# Altium integrated library LEMO Unipole And Multipole Type Connectors.IntLib: 1566 symbols (part 3 of 13) (continued)
## EED.2K.310.CLN (continued)
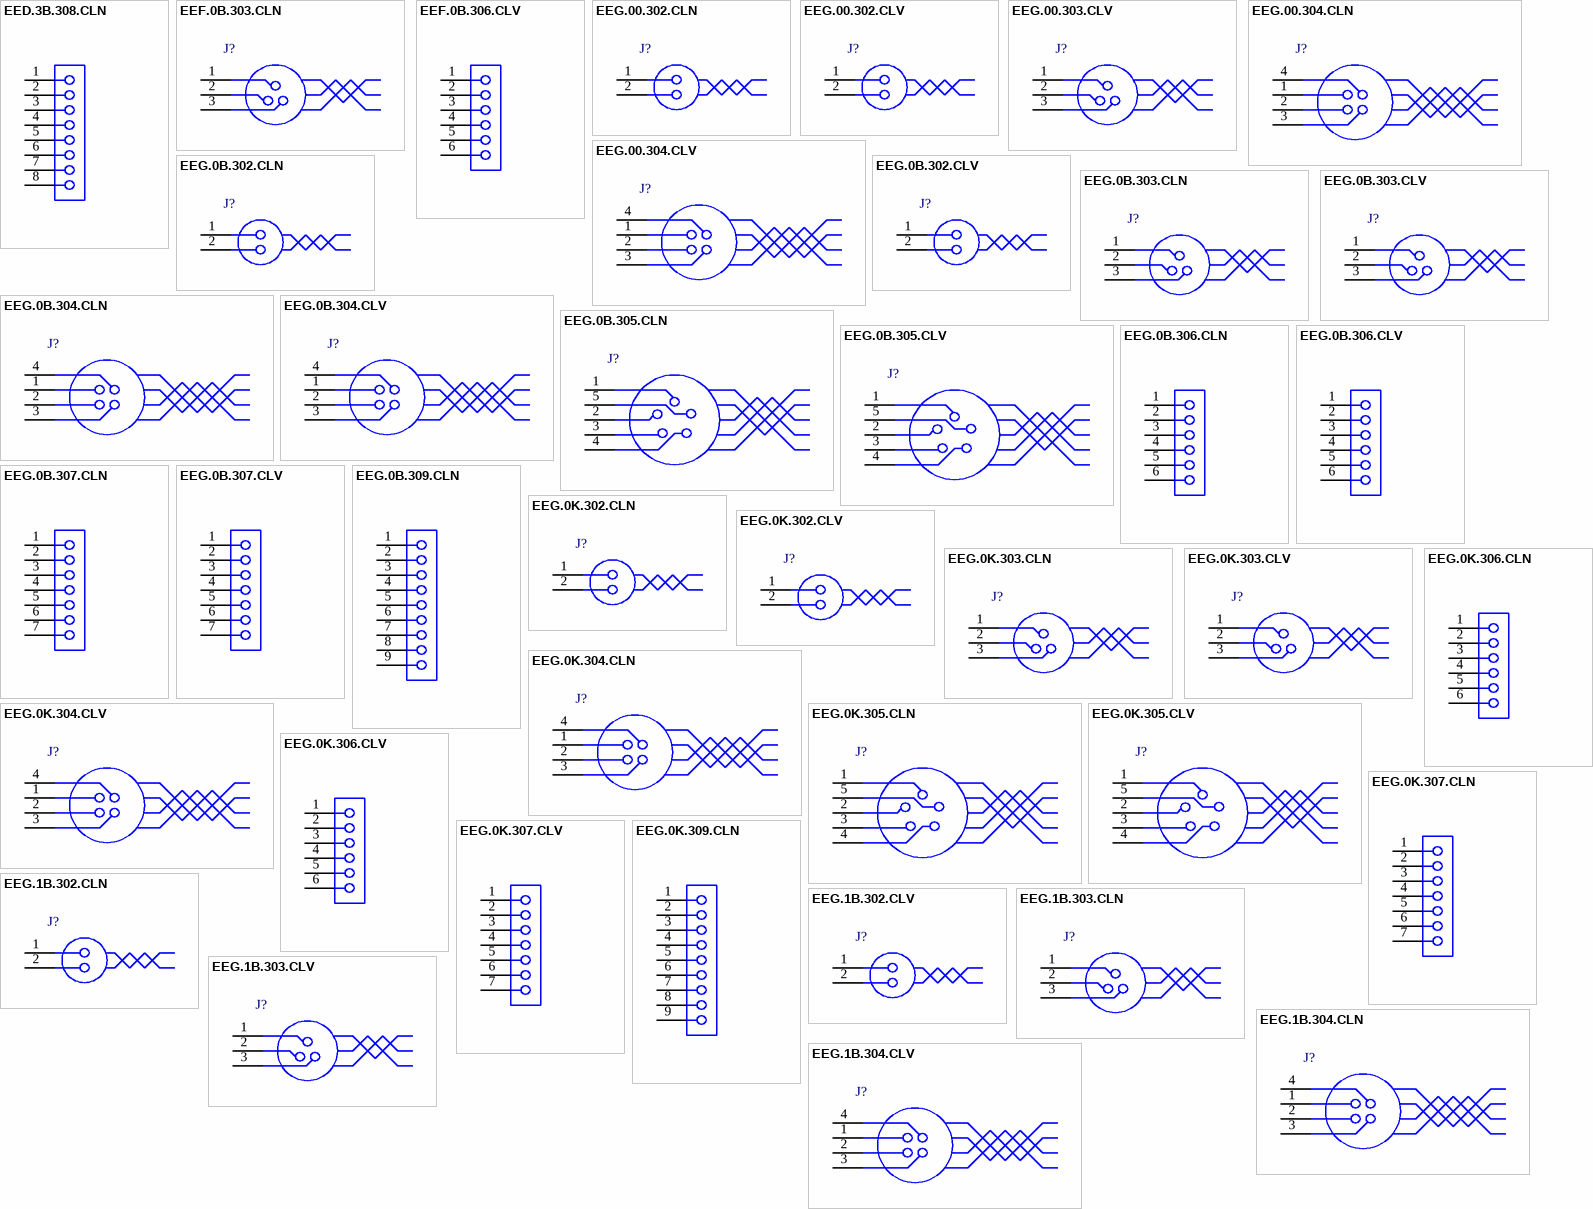
[diagram p9: symbols EED.3B.308.CLN to EEG.1B.304.CLV]

## EED.3B.308.CLN
designator J?
Fixed receptacle, nut fixing with straight contacts for printed circuit(back panel mounting), Key (D), 3B series, Multipole Type with 8 Contacts; Manufacturer: LEMO; PartNumber: EED.3B.308.CLN; Number of contacts: 8; Contact Diameter: 1.3 mm; AWG: 20; Rated Current(A): 13; DatasheetVersion: Jun-14; PackageReference: EED.3B.308.CLN; PackageDescription: Fixed receptacle, nut fixing with straight contacts for printed circuit(back panel mounting), Key(D) for Printed Circuit; ComponentLink1Description: Manufacturer URL; ComponentLink1URL: http://www.lemo.com; ComponentLink2Description: Datasheet; ComponentLink2URL: http://intra.lemo.ch/catalog/ROW/UK_English/unipole_multipole.pdf
footprint EED.3B.308.CLN (Socket, Female, Body 18mm dia. Height 28.1 mm, Through hole)
pins: 1, 2, 3, 4, 5, 6, 7, 8

## EEF.0B.303.CLN
designator J?
Fixed receptacle, nut fixing with straight contacts for printed circuit(back panel mounting), Key (F), 0B series, Multipole Type with 3 Contacts; Manufacturer: LEMO; PartNumber: EEF.0B.303.CLN; Number of contacts: 3; Contact Diameter: 0.9 mm; AWG: 22; Rated Current(A): 8; DatasheetVersion: Jun-14; PackageReference: EEF.0B.303.CLN; PackageDescription: Fixed receptacle, nut fixing with straight contacts for printed circuit(back panel mounting), Key(F) for Printed Circuit; ComponentLink1Description: Manufacturer URL; ComponentLink1URL: http://www.lemo.com; ComponentLink2Description: Datasheet; ComponentLink2URL: http://intra.lemo.ch/catalog/ROW/UK_English/unipole_multipole.pdf
footprint EEF.0B.303.CLN (Socket, Female, Body 9mm dia. Height 16.3 mm, Through hole)
pins: 1, 2, 3

## EEF.0B.306.CLV
designator J?
Fixed receptacle, nut fixing with elbow contacts for printed circuit(back panel mounting), Key (F), 0B series, Multipole Type with 6 Contacts; Manufacturer: LEMO; PartNumber: EEF.0B.306.CLV; Number of contacts: 6; Contact Diameter: 0.5 mm; AWG: 28; Rated Current(A): 0; DatasheetVersion: Jun-14; PackageReference: EEF.0B.306.CLV; PackageDescription: Fixed receptacle, nut fixing with elbow contacts for printed circuit(back panel mounting), Key(F) for Printed Circuit; ComponentLink1Description: Manufacturer URL; ComponentLink1URL: http://www.lemo.com; ComponentLink2Description: Datasheet; ComponentLink2URL: http://intra.lemo.ch/catalog/ROW/UK_English/unipole_multipole.pdf
footprint EEF.0B.306.CLV (Socket, Female, Body 9mm dia. Height 19.1 mm, Through hole)
pins: 1, 2, 3, 4, 5, 6

## EEG.00.302.CLN
designator J?
Fixed receptacle, nut fixing (back panel mounting), Key (G), 00 series, Multipole Type with 2 Contacts; Manufacturer: LEMO; PartNumber: EEG.00.302.CLN; Number of contacts: 2; Contact Diameter: 0.5 mm; AWG: 28; Rated Current(A): 5; DatasheetVersion: Jun-14; PackageReference: EEG.00.302.CLN; PackageDescription: Fixed receptacle, nut fixing (back panel mounting), Key(G) for Printed Circuit; Supplier 1: Mouser; Supplier Part Number 1: 736-EEG00302CLN; Supplier 2: Newark; Supplier Part Number 2: 80R0502; Supplier 3: Digi-Key; Supplier Part Number 3: EEG.00.302.CLN-ND; ComponentLink1Description: Manufacturer URL; ComponentLink1URL: http://www.lemo.com; ComponentLink2Description: Datasheet; ComponentLink2URL: http://intra.lemo.ch/catalog/ROW/UK_English/unipole_multipole.pdf
footprint EEG.00.302.CLN (Socket, Female, Body 7mm dia. Height 13.7 mm, Through hole)
pins: 1, 2

## EEG.00.302.CLV
designator J?
Fixed receptacle, nut fixing (back panel mounting), Key (G), 00 series, Multipole Type with 2 Contacts; Manufacturer: LEMO; PartNumber: EEG.00.302.CLV; Number of contacts: 2; Contact Diameter: 0.5 mm; AWG: 28; Rated Current(A): 0; DatasheetVersion: Jun-14; PackageReference: EEG.00.302.CLV; PackageDescription: Fixed receptacle, nut fixing (back panel mounting), Key(G) for Printed Circuit; ComponentLink1Description: Manufacturer URL; ComponentLink1URL: http://www.lemo.com; ComponentLink2Description: Datasheet; ComponentLink2URL: http://intra.lemo.ch/catalog/ROW/UK_English/unipole_multipole.pdf
footprint EEG.00.302.CLV (Socket, Female, Body 7mm dia. Height 13.7 mm, Through hole)
pins: 1, 2

## EEG.00.303.CLV
designator J?
Fixed receptacle, nut fixing (back panel mounting), Key (G), 00 series, Multipole Type with 3 Contacts; Manufacturer: LEMO; PartNumber: EEG.00.303.CLV; Number of contacts: 3; Contact Diameter: 0.5 mm; AWG: 28; Rated Current(A): 0; DatasheetVersion: Jun-14; PackageReference: EEG.00.303.CLV; PackageDescription: Fixed receptacle, nut fixing (back panel mounting), Key(G) for Printed Circuit; ComponentLink1Description: Manufacturer URL; ComponentLink1URL: http://www.lemo.com; ComponentLink2Description: Datasheet; ComponentLink2URL: http://intra.lemo.ch/catalog/ROW/UK_English/unipole_multipole.pdf
footprint EEG.00.303.CLV (Socket, Female, Body 7mm dia. Height 13.7 mm, Through hole)
pins: 1, 2, 3

## EEG.00.304.CLN
designator J?
Fixed receptacle, nut fixing (back panel mounting), Key (G), 00 series, Multipole Type with 4 Contacts; Manufacturer: LEMO; PartNumber: EEG.00.304.CLN; Number of contacts: 4; Contact Diameter: 0.5 mm; AWG: 28; Rated Current(A): 2; DatasheetVersion: Jun-14; PackageReference: EEG.00.304.CLN; PackageDescription: Fixed receptacle, nut fixing (back panel mounting), Key(G) for Printed Circuit; Supplier 1: Mouser; Supplier Part Number 1: N/A; Supplier 2: Newark; Supplier Part Number 2: 75R5781; ComponentLink1Description: Manufacturer URL; ComponentLink1URL: http://www.lemo.com; ComponentLink2Description: Datasheet; ComponentLink2URL: http://intra.lemo.ch/catalog/ROW/UK_English/unipole_multipole.pdf
footprint EEG.00.304.CLN (Socket, Female, Body 7mm dia. Height 13.7 mm, Through hole)
pins: 1, 2, 3, 4

## EEG.00.304.CLV
designator J?
Fixed receptacle, nut fixing (back panel mounting), Key (G), 00 series, Multipole Type with 4 Contacts; Manufacturer: LEMO; PartNumber: EEG.00.304.CLV; Number of contacts: 4; Contact Diameter: 0.5 mm; AWG: 28; Rated Current(A): 0; DatasheetVersion: Jun-14; PackageReference: EEG.00.304.CLV; PackageDescription: Fixed receptacle, nut fixing (back panel mounting), Key(G) for Printed Circuit; Supplier 1: Mouser; Supplier Part Number 1: 736-EEG00304CLV; Supplier 2: Digi-Key; Supplier Part Number 2: EEG.00.304.CLV-ND; ComponentLink1Description: Manufacturer URL; ComponentLink1URL: http://www.lemo.com; ComponentLink2Description: Datasheet; ComponentLink2URL: http://intra.lemo.ch/catalog/ROW/UK_English/unipole_multipole.pdf
footprint EEG.00.304.CLV (Socket, Female, Body 7mm dia. Height 13.7 mm, Through hole)
pins: 1, 2, 3, 4

## EEG.0B.302.CLN
designator J?
Fixed receptacle, nut fixing with straight contacts for printed circuit(back panel mounting), Key (G), 0B series, Multipole Type with 2 Contacts; Manufacturer: LEMO; PartNumber: EEG.0B.302.CLN; Number of contacts: 2; Contact Diameter: 0.9 mm; AWG: 22; Rated Current(A): 10; DatasheetVersion: Jun-14; PackageReference: EEG.0B.302.CLN; PackageDescription: Fixed receptacle, nut fixing with straight contacts for printed circuit(back panel mounting), Key(G) for Printed Circuit; Supplier 1: Mouser; Supplier Part Number 1: 736-EEG0B302CLN; Supplier 2: Newark; Supplier Part Number 2: 80T8968; Supplier 3: Digi-Key; Supplier Part Number 3: EEG.0B.302.CLN-ND; ComponentLink1Description: Manufacturer URL; ComponentLink1URL: http://www.lemo.com; ComponentLink2Description: Datasheet; ComponentLink2URL: http://intra.lemo.ch/catalog/ROW/UK_English/unipole_multipole.pdf
footprint EEG.0B.302.CLN (Socket, Female, Body 9mm dia. Height 16.3 mm, Through hole)
pins: 1, 2

## EEG.0B.302.CLV
designator J?
Fixed receptacle, nut fixing with elbow contacts for printed circuit(back panel mounting), Key (G), 0B series, Multipole Type with 2 Contacts; Manufacturer: LEMO; PartNumber: EEG.0B.302.CLV; Number of contacts: 2; Contact Diameter: 0.9 mm; AWG: 22; Rated Current(A): 6; DatasheetVersion: Jun-14; PackageReference: EEG.0B.302.CLV; PackageDescription: Fixed receptacle, nut fixing with elbow contacts for printed circuit(back panel mounting), Key(G) for Printed Circuit; Supplier 1: Mouser; Supplier Part Number 1: 736-EEG0B302CLV; Supplier 2: Digi-Key; Supplier Part Number 2: EEG.0B.302.CLV-ND; ComponentLink1Description: Manufacturer URL; ComponentLink1URL: http://www.lemo.com; ComponentLink2Description: Datasheet; ComponentLink2URL: http://intra.lemo.ch/catalog/ROW/UK_English/unipole_multipole.pdf
footprint EEG.0B.302.CLV (Socket, Female, Body 9mm dia. Height 19.1 mm, Through hole)
pins: 1, 2

## EEG.0B.303.CLN
designator J?
Fixed receptacle, nut fixing with straight contacts for printed circuit(back panel mounting), Key (G), 0B series, Multipole Type with 3 Contacts; Manufacturer: LEMO; PartNumber: EEG.0B.303.CLN; Number of contacts: 3; Contact Diameter: 0.9 mm; AWG: 22; Rated Current(A): 8; DatasheetVersion: Jun-14; PackageReference: EEG.0B.303.CLN; PackageDescription: Fixed receptacle, nut fixing with straight contacts for printed circuit(back panel mounting), Key(G) for Printed Circuit; Supplier 1: Mouser; Supplier Part Number 1: 736-EEG0B303CLN; Supplier 2: Newark; Supplier Part Number 2: 80T8969; Supplier 3: Digi-Key; Supplier Part Number 3: EEG.0B.303.CLN-ND; ComponentLink1Description: Manufacturer URL; ComponentLink1URL: http://www.lemo.com; ComponentLink2Description: Datasheet; ComponentLink2URL: http://intra.lemo.ch/catalog/ROW/UK_English/unipole_multipole.pdf
footprint EEG.0B.303.CLN (Socket, Female, Body 9mm dia. Height 16.3 mm, Through hole)
pins: 1, 2, 3

## EEG.0B.303.CLV
designator J?
Fixed receptacle, nut fixing with elbow contacts for printed circuit(back panel mounting), Key (G), 0B series, Multipole Type with 3 Contacts; Manufacturer: LEMO; PartNumber: EEG.0B.303.CLV; Number of contacts: 3; Contact Diameter: 0.9 mm; AWG: 22; Rated Current(A): 6; DatasheetVersion: Jun-14; PackageReference: EEG.0B.303.CLV; PackageDescription: Fixed receptacle, nut fixing with elbow contacts for printed circuit(back panel mounting), Key(G) for Printed Circuit; Supplier 1: Mouser; Supplier Part Number 1: 736-EEG0B303CLV; Supplier 2: Digi-Key; Supplier Part Number 2: EEG.0B.303.CLV-ND; ComponentLink1Description: Manufacturer URL; ComponentLink1URL: http://www.lemo.com; ComponentLink2Description: Datasheet; ComponentLink2URL: http://intra.lemo.ch/catalog/ROW/UK_English/unipole_multipole.pdf
footprint EEG.0B.303.CLV (Socket, Female, Body 9mm dia. Height 19.1 mm, Through hole)
pins: 1, 2, 3

## EEG.0B.304.CLN
designator J?
Fixed receptacle, nut fixing with straight contacts for printed circuit(back panel mounting), Key (G), 0B series, Multipole Type with 4 Contacts; Manufacturer: LEMO; PartNumber: EEG.0B.304.CLN; Number of contacts: 4; Contact Diameter: 0.7 mm; AWG: 24; Rated Current(A): 7; DatasheetVersion: Jun-14; PackageReference: EEG.0B.304.CLN; PackageDescription: Fixed receptacle, nut fixing with straight contacts for printed circuit(back panel mounting), Key(G) for Printed Circuit; Supplier 1: Mouser; Supplier Part Number 1: 736-EEG0B304CLN; Supplier 2: Newark; Supplier Part Number 2: 47T7026; Supplier 3: Digi-Key; Supplier Part Number 3: EEG.0B.304.CLN-ND; ComponentLink1Description: Manufacturer URL; ComponentLink1URL: http://www.lemo.com; ComponentLink2Description: Datasheet; ComponentLink2URL: http://intra.lemo.ch/catalog/ROW/UK_English/unipole_multipole.pdf
footprint EEG.0B.304.CLN (Socket, Female, Body 9mm dia. Height 16.3 mm, Through hole)
pins: 1, 2, 3, 4

## EEG.0B.304.CLV
designator J?
Fixed receptacle, nut fixing with elbow contacts for printed circuit(back panel mounting), Key (G), 0B series, Multipole Type with 4 Contacts; Manufacturer: LEMO; PartNumber: EEG.0B.304.CLV; Number of contacts: 4; Contact Diameter: 0.7 mm; AWG: 24; Rated Current(A): 6; DatasheetVersion: Jun-14; PackageReference: EEG.0B.304.CLV; PackageDescription: Fixed receptacle, nut fixing with elbow contacts for printed circuit(back panel mounting), Key(G) for Printed Circuit; Supplier 1: Mouser; Supplier Part Number 1: 736-EEG0B304CLV; Supplier 2: Newark; Supplier Part Number 2: 15R8984; Supplier 3: Digi-Key; Supplier Part Number 3: EEG.0B.304.CLV-ND; ComponentLink1Description: Manufacturer URL; ComponentLink1URL: http://www.lemo.com; ComponentLink2Description: Datasheet; ComponentLink2URL: http://intra.lemo.ch/catalog/ROW/UK_English/unipole_multipole.pdf
footprint EEG.0B.304.CLV (Socket, Female, Body 9mm dia. Height 19.1 mm, Through hole)
pins: 1, 2, 3, 4

## EEG.0B.305.CLN
designator J?
Fixed receptacle, nut fixing with straight contacts for printed circuit(back panel mounting), Key (G), 0B series, Multipole Type with 5 Contacts; Manufacturer: LEMO; PartNumber: EEG.0B.305.CLN; Number of contacts: 5; Contact Diameter: 0.7 mm; AWG: 24; Rated Current(A): 6.5; DatasheetVersion: Jun-14; PackageReference: EEG.0B.305.CLN; PackageDescription: Fixed receptacle, nut fixing with straight contacts for printed circuit(back panel mounting), Key(G) for Printed Circuit; Supplier 1: Mouser; Supplier Part Number 1: 736-EEG0B305CLN; Supplier 2: Newark; Supplier Part Number 2: 90T4985; Supplier 3: Digi-Key; Supplier Part Number 3: EEG.0B.305.CLN-ND; ComponentLink1Description: Manufacturer URL; ComponentLink1URL: http://www.lemo.com; ComponentLink2Description: Datasheet; ComponentLink2URL: http://intra.lemo.ch/catalog/ROW/UK_English/unipole_multipole.pdf
footprint EEG.0B.305.CLN (Socket, Female, Body 9mm dia. Height 16.3 mm, Through hole)
pins: 1, 2, 3, 4, 5

## EEG.0B.305.CLV
designator J?
Fixed receptacle, nut fixing with elbow contacts for printed circuit(back panel mounting), Key (G), 0B series, Multipole Type with 5 Contacts; Manufacturer: LEMO; PartNumber: EEG.0B.305.CLV; Number of contacts: 5; Contact Diameter: 0.7 mm; AWG: 24; Rated Current(A): 6; DatasheetVersion: Jun-14; PackageReference: EEG.0B.305.CLV; PackageDescription: Fixed receptacle, nut fixing with elbow contacts for printed circuit(back panel mounting), Key(G) for Printed Circuit; Supplier 1: Mouser; Supplier Part Number 1: 736-EEG0B305CLV; Supplier 2: Digi-Key; Supplier Part Number 2: EEG.0B.305.CLV-ND; ComponentLink1Description: Manufacturer URL; ComponentLink1URL: http://www.lemo.com; ComponentLink2Description: Datasheet; ComponentLink2URL: http://intra.lemo.ch/catalog/ROW/UK_English/unipole_multipole.pdf
footprint EEG.0B.305.CLV (Socket, Female, Body 9mm dia. Height 19.1 mm, Through hole)
pins: 1, 2, 3, 4, 5

## EEG.0B.306.CLN
designator J?
Fixed receptacle, nut fixing with straight contacts for printed circuit(back panel mounting), Key (G), 0B series, Multipole Type with 6 Contacts; Manufacturer: LEMO; PartNumber: EEG.0B.306.CLN; Number of contacts: 6; Contact Diameter: 0.5 mm; AWG: 28; Rated Current(A): 2.5; DatasheetVersion: Jun-14; PackageReference: EEG.0B.306.CLN; PackageDescription: Fixed receptacle, nut fixing with straight contacts for printed circuit(back panel mounting), Key(G) for Printed Circuit; Supplier 1: Mouser; Supplier Part Number 1: 736-EEG0B306CLN; Supplier 2: Digi-Key; Supplier Part Number 2: EEG.0B.306.CLN-ND; ComponentLink1Description: Manufacturer URL; ComponentLink1URL: http://www.lemo.com; ComponentLink2Description: Datasheet; ComponentLink2URL: http://intra.lemo.ch/catalog/ROW/UK_English/unipole_multipole.pdf
footprint EEG.0B.306.CLN (Socket, Female, Body 9mm dia. Height 16.3 mm, Through hole)
pins: 1, 2, 3, 4, 5, 6

## EEG.0B.306.CLV
designator J?
Fixed receptacle, nut fixing with elbow contacts for printed circuit(back panel mounting), Key (G), 0B series, Multipole Type with 6 Contacts; Manufacturer: LEMO; PartNumber: EEG.0B.306.CLV; Number of contacts: 6; Contact Diameter: 0.5 mm; AWG: 28; Rated Current(A): 0; DatasheetVersion: Jun-14; PackageReference: EEG.0B.306.CLV; PackageDescription: Fixed receptacle, nut fixing with elbow contacts for printed circuit(back panel mounting), Key(G) for Printed Circuit; Supplier 1: Mouser; Supplier Part Number 1: 736-EEG0B306CLV; Supplier 2: Digi-Key; Supplier Part Number 2: EEG.0B.306.CLV-ND; ComponentLink1Description: Manufacturer URL; ComponentLink1URL: http://www.lemo.com; ComponentLink2Description: Datasheet; ComponentLink2URL: http://intra.lemo.ch/catalog/ROW/UK_English/unipole_multipole.pdf
footprint EEG.0B.306.CLV (Socket, Female, Body 9mm dia. Height 19.1 mm, Through hole)
pins: 1, 2, 3, 4, 5, 6

## EEG.0B.307.CLN
designator J?
Fixed receptacle, nut fixing with straight contacts for printed circuit(back panel mounting), Key (G), 0B series, Multipole Type with 7 Contacts; Manufacturer: LEMO; PartNumber: EEG.0B.307.CLN; Number of contacts: 7; Contact Diameter: 0.5 mm; AWG: 28; Rated Current(A): 2.5; DatasheetVersion: Jun-14; PackageReference: EEG.0B.307.CLN; PackageDescription: Fixed receptacle, nut fixing with straight contacts for printed circuit(back panel mounting), Key(G) for Printed Circuit; Supplier 1: Mouser; Supplier Part Number 1: 736-EEG0B307CLN; Supplier 2: Newark; Supplier Part Number 2: 68R6335; Supplier 3: Digi-Key; Supplier Part Number 3: EEG.0B.307.CLN-ND; ComponentLink1Description: Manufacturer URL; ComponentLink1URL: http://www.lemo.com; ComponentLink2Description: Datasheet; ComponentLink2URL: http://intra.lemo.ch/catalog/ROW/UK_English/unipole_multipole.pdf
footprint EEG.0B.307.CLN (Socket, Female, Body 9mm dia. Height 16.3 mm, Through hole)
pins: 1, 2, 3, 4, 5, 6, 7

## EEG.0B.307.CLV
designator J?
Fixed receptacle, nut fixing with elbow contacts for printed circuit(back panel mounting), Key (G), 0B series, Multipole Type with 7 Contacts; Manufacturer: LEMO; PartNumber: EEG.0B.307.CLV; Number of contacts: 7; Contact Diameter: 0.5 mm; AWG: 28; Rated Current(A): 0; DatasheetVersion: Jun-14; PackageReference: EEG.0B.307.CLV; PackageDescription: Fixed receptacle, nut fixing with elbow contacts for printed circuit(back panel mounting), Key(G) for Printed Circuit; Supplier 1: Mouser; Supplier Part Number 1: 736-EEG0B307CLV; Supplier 2: Digi-Key; Supplier Part Number 2: EEG.0B.307.CLV-ND; ComponentLink1Description: Manufacturer URL; ComponentLink1URL: http://www.lemo.com; ComponentLink2Description: Datasheet; ComponentLink2URL: http://intra.lemo.ch/catalog/ROW/UK_English/unipole_multipole.pdf
footprint EEG.0B.307.CLV (Socket, Female, Body 9mm dia. Height 19.1 mm, Through hole)
pins: 1, 2, 3, 4, 5, 6, 7

## EEG.0B.309.CLN
designator J?
Fixed receptacle, nut fixing with straight contacts for printed circuit(back panel mounting), Key (G), 0B series, Multipole Type with 9 Contacts; Manufacturer: LEMO; PartNumber: EEG.0B.309.CLN; Number of contacts: 9; Contact Diameter: 0.5 mm; AWG: 28; Rated Current(A): 2; DatasheetVersion: Jun-14; PackageReference: EEG.0B.309.CLN; PackageDescription: Fixed receptacle, nut fixing with straight contacts for printed circuit(back panel mounting), Key(G) for Printed Circuit; Supplier 1: Mouser; Supplier Part Number 1: 736-EEG0B309CLN; Supplier 2: Newark; Supplier Part Number 2: 87R4866; Supplier 3: Digi-Key; Supplier Part Number 3: EEG.0B.309.CLN-ND; ComponentLink1Description: Manufacturer URL; ComponentLink1URL: http://www.lemo.com; ComponentLink2Description: Datasheet; ComponentLink2URL: http://intra.lemo.ch/catalog/ROW/UK_English/unipole_multipole.pdf
footprint EEG.0B.309.CLN (Socket, Female, Body 9mm dia. Height 16.3 mm, Through hole)
pins: 1, 2, 3, 4, 5, 6, 7, 8, 9

## EEG.0K.302.CLN
designator J?
Fixed receptacle, nut fixing, with straight contacts for printed circuit (back panel mounting), Key (G), 0K series, Multipole Type with 2 Contacts; Manufacturer: LEMO; PartNumber: EEG.0K.302.CLN; Number of contacts: 2; Contact Diameter: 0.9 mm; AWG: 22; Rated Current(A): 10; DatasheetVersion: Jun-14; PackageReference: EEG.0K.302.CLN; PackageDescription: Fixed receptacle, nut fixing, with straight contacts for printed circuit (back panel mounting), Key(G) for Printed Circuit; Supplier 1: Mouser; Supplier Part Number 1: 736-EEG0K302CLN; Supplier 2: Digi-Key; Supplier Part Number 2: EEG.0K.302.CLN-ND; ComponentLink1Description: Manufacturer URL; ComponentLink1URL: http://www.lemo.com; ComponentLink2Description: Datasheet; ComponentLink2URL: http://intra.lemo.ch/catalog/ROW/UK_English/unipole_multipole.pdf
footprint EEG.0K.302.CLN (Socket, Female, Body 14mm dia. Height 17.6 mm, Through hole)
pins: 1, 2

## EEG.0K.302.CLV
designator J?
Fixed receptacle, nut fixing, with elbow contacts for printed circuit (back panel mounting), Key (G), 0K series, Multipole Type with 2 Contacts; Manufacturer: LEMO; PartNumber: EEG.0K.302.CLV; Number of contacts: 2; Contact Diameter: 0.9 mm; AWG: 22; Rated Current(A): 6; DatasheetVersion: Jun-14; PackageReference: EEG.0K.302.CLV; PackageDescription: Fixed receptacle, nut fixing, with elbow contacts for printed circuit (back panel mounting), Key(G) for Printed Circuit; Supplier 1: Mouser; Supplier Part Number 1: 736-EEG0K302CLV; Supplier 2: Digi-Key; Supplier Part Number 2: EEG.0K.302.CLV-ND; ComponentLink1Description: Manufacturer URL; ComponentLink1URL: http://www.lemo.com; ComponentLink2Description: Datasheet; ComponentLink2URL: http://intra.lemo.ch/catalog/ROW/UK_English/unipole_multipole.pdf
footprint EEG.0K.302.CLV (Socket, Female, Body 14mm dia. Height 19.3 mm, Through hole)
pins: 1, 2

## EEG.0K.303.CLN
designator J?
Fixed receptacle, nut fixing, with straight contacts for printed circuit (back panel mounting), Key (G), 0K series, Multipole Type with 3 Contacts; Manufacturer: LEMO; PartNumber: EEG.0K.303.CLN; Number of contacts: 3; Contact Diameter: 0.9 mm; AWG: 22; Rated Current(A): 8; DatasheetVersion: Jun-14; PackageReference: EEG.0K.303.CLN; PackageDescription: Fixed receptacle, nut fixing, with straight contacts for printed circuit (back panel mounting), Key(G) for Printed Circuit; Supplier 1: Mouser; Supplier Part Number 1: 736-EEG0K303CLN; Supplier 2: Newark; Supplier Part Number 2: 30X9769; Supplier 3: Digi-Key; Supplier Part Number 3: EEG.0K.303.CLN-ND; ComponentLink1Description: Manufacturer URL; ComponentLink1URL: http://www.lemo.com; ComponentLink2Description: Datasheet; ComponentLink2URL: http://intra.lemo.ch/catalog/ROW/UK_English/unipole_multipole.pdf
footprint EEG.0K.303.CLN (Socket, Female, Body 14mm dia. Height 17.6 mm, Through hole)
pins: 1, 2, 3

## EEG.0K.303.CLV
designator J?
Fixed receptacle, nut fixing, with elbow contacts for printed circuit (back panel mounting), Key (G), 0K series, Multipole Type with 3 Contacts; Manufacturer: LEMO; PartNumber: EEG.0K.303.CLV; Number of contacts: 3; Contact Diameter: 0.9 mm; AWG: 22; Rated Current(A): 6; DatasheetVersion: Jun-14; PackageReference: EEG.0K.303.CLV; PackageDescription: Fixed receptacle, nut fixing, with elbow contacts for printed circuit (back panel mounting), Key(G) for Printed Circuit; Supplier 1: Mouser; Supplier Part Number 1: 736-EEG0K303CLV; Supplier 2: Digi-Key; Supplier Part Number 2: EEG.0K.303.CLV-ND; ComponentLink1Description: Manufacturer URL; ComponentLink1URL: http://www.lemo.com; ComponentLink2Description: Datasheet; ComponentLink2URL: http://intra.lemo.ch/catalog/ROW/UK_English/unipole_multipole.pdf
footprint EEG.0K.303.CLV (Socket, Female, Body 14mm dia. Height 19.3 mm, Through hole)
pins: 1, 2, 3

## EEG.0K.304.CLN
designator J?
Fixed receptacle, nut fixing, with straight contacts for printed circuit (back panel mounting), Key (G), 0K series, Multipole Type with 4 Contacts; Manufacturer: LEMO; PartNumber: EEG.0K.304.CLN; Number of contacts: 4; Contact Diameter: 0.7 mm; AWG: 24; Rated Current(A): 7; DatasheetVersion: Jun-14; PackageReference: EEG.0K.304.CLN; PackageDescription: Fixed receptacle, nut fixing, with straight contacts for printed circuit (back panel mounting), Key(G) for Printed Circuit; Supplier 1: Mouser; Supplier Part Number 1: 736-EEG0K304CLN; Supplier 2: Digi-Key; Supplier Part Number 2: EEG.0K.304.CLN-ND; ComponentLink1Description: Manufacturer URL; ComponentLink1URL: http://www.lemo.com; ComponentLink2Description: Datasheet; ComponentLink2URL: http://intra.lemo.ch/catalog/ROW/UK_English/unipole_multipole.pdf
footprint EEG.0K.304.CLN (Socket, Female, Body 14mm dia. Height 17.6 mm, Through hole)
pins: 1, 2, 3, 4

## EEG.0K.304.CLV
designator J?
Fixed receptacle, nut fixing, with elbow contacts for printed circuit (back panel mounting), Key (G), 0K series, Multipole Type with 4 Contacts; Manufacturer: LEMO; PartNumber: EEG.0K.304.CLV; Number of contacts: 4; Contact Diameter: 0.7 mm; AWG: 24; Rated Current(A): 6; DatasheetVersion: Jun-14; PackageReference: EEG.0K.304.CLV; PackageDescription: Fixed receptacle, nut fixing, with elbow contacts for printed circuit (back panel mounting), Key(G) for Printed Circuit; Supplier 1: Mouser; Supplier Part Number 1: 736-EEG0K304CLV; Supplier 2: Digi-Key; Supplier Part Number 2: EEG.0K.304.CLV-ND; ComponentLink1Description: Manufacturer URL; ComponentLink1URL: http://www.lemo.com; ComponentLink2Description: Datasheet; ComponentLink2URL: http://intra.lemo.ch/catalog/ROW/UK_English/unipole_multipole.pdf
footprint EEG.0K.304.CLV (Socket, Female, Body 14mm dia. Height 19.3 mm, Through hole)
pins: 1, 2, 3, 4

## EEG.0K.305.CLN
designator J?
Fixed receptacle, nut fixing, with straight contacts for printed circuit (back panel mounting), Key (G), 0K series, Multipole Type with 5 Contacts; Manufacturer: LEMO; PartNumber: EEG.0K.305.CLN; Number of contacts: 5; Contact Diameter: 0.7 mm; AWG: 24; Rated Current(A): 6.5; DatasheetVersion: Jun-14; PackageReference: EEG.0K.305.CLN; PackageDescription: Fixed receptacle, nut fixing, with straight contacts for printed circuit (back panel mounting), Key(G) for Printed Circuit; Supplier 1: Mouser; Supplier Part Number 1: 736-EEG0K305CLN; Supplier 2: Digi-Key; Supplier Part Number 2: EEG.0K.305.CLN-ND; ComponentLink1Description: Manufacturer URL; ComponentLink1URL: http://www.lemo.com; ComponentLink2Description: Datasheet; ComponentLink2URL: http://intra.lemo.ch/catalog/ROW/UK_English/unipole_multipole.pdf
footprint EEG.0K.305.CLN (Socket, Female, Body 14mm dia. Height 17.6 mm, Through hole)
pins: 1, 2, 3, 4, 5

## EEG.0K.305.CLV
designator J?
Fixed receptacle, nut fixing, with elbow contacts for printed circuit (back panel mounting), Key (G), 0K series, Multipole Type with 5 Contacts; Manufacturer: LEMO; PartNumber: EEG.0K.305.CLV; Number of contacts: 5; Contact Diameter: 0.7 mm; AWG: 24; Rated Current(A): 6; DatasheetVersion: Jun-14; PackageReference: EEG.0K.305.CLV; PackageDescription: Fixed receptacle, nut fixing, with elbow contacts for printed circuit (back panel mounting), Key(G) for Printed Circuit; Supplier 1: Mouser; Supplier Part Number 1: 736-EEG0K305CLV; Supplier 2: Digi-Key; Supplier Part Number 2: EEG.0K.305.CLV-ND; ComponentLink1Description: Manufacturer URL; ComponentLink1URL: http://www.lemo.com; ComponentLink2Description: Datasheet; ComponentLink2URL: http://intra.lemo.ch/catalog/ROW/UK_English/unipole_multipole.pdf
footprint EEG.0K.305.CLV (Socket, Female, Body 14mm dia. Height 19.3 mm, Through hole)
pins: 1, 2, 3, 4, 5

## EEG.0K.306.CLN
designator J?
Fixed receptacle, nut fixing, with straight contacts for printed circuit (back panel mounting), Key (G), 0K series, Multipole Type with 6 Contacts; Manufacturer: LEMO; PartNumber: EEG.0K.306.CLN; Number of contacts: 6; Contact Diameter: 0.5 mm; AWG: 28; Rated Current(A): 2.5; DatasheetVersion: Jun-14; PackageReference: EEG.0K.306.CLN; PackageDescription: Fixed receptacle, nut fixing, with straight contacts for printed circuit (back panel mounting), Key(G) for Printed Circuit; Supplier 1: Mouser; Supplier Part Number 1: 736-EEG0K306CLN; Supplier 2: Digi-Key; Supplier Part Number 2: EEG.0K.306.CLN-ND; ComponentLink1Description: Manufacturer URL; ComponentLink1URL: http://www.lemo.com; ComponentLink2Description: Datasheet; ComponentLink2URL: http://intra.lemo.ch/catalog/ROW/UK_English/unipole_multipole.pdf
footprint EEG.0K.306.CLN (Socket, Female, Body 14mm dia. Height 17.6 mm, Through hole)
pins: 1, 2, 3, 4, 5, 6

## EEG.0K.306.CLV
designator J?
Fixed receptacle, nut fixing, with elbow contacts for printed circuit (back panel mounting), Key (G), 0K series, Multipole Type with 6 Contacts; Manufacturer: LEMO; PartNumber: EEG.0K.306.CLV; Number of contacts: 6; Contact Diameter: 0.5 mm; AWG: 28; Rated Current(A): 0; DatasheetVersion: Jun-14; PackageReference: EEG.0K.306.CLV; PackageDescription: Fixed receptacle, nut fixing, with elbow contacts for printed circuit (back panel mounting), Key(G) for Printed Circuit; ComponentLink1Description: Manufacturer URL; ComponentLink1URL: http://www.lemo.com; ComponentLink2Description: Datasheet; ComponentLink2URL: http://intra.lemo.ch/catalog/ROW/UK_English/unipole_multipole.pdf
footprint EEG.0K.306.CLV (Socket, Female, Body 14mm dia. Height 19.3 mm, Through hole)
pins: 1, 2, 3, 4, 5, 6

## EEG.0K.307.CLN
designator J?
Fixed receptacle, nut fixing, with straight contacts for printed circuit (back panel mounting), Key (G), 0K series, Multipole Type with 7 Contacts; Manufacturer: LEMO; PartNumber: EEG.0K.307.CLN; Number of contacts: 7; Contact Diameter: 0.5 mm; AWG: 28; Rated Current(A): 2.5; DatasheetVersion: Jun-14; PackageReference: EEG.0K.307.CLN; PackageDescription: Fixed receptacle, nut fixing, with straight contacts for printed circuit (back panel mounting), Key(G) for Printed Circuit; Supplier 1: Mouser; Supplier Part Number 1: 736-EEG0K307CLN; Supplier 2: Digi-Key; Supplier Part Number 2: EEG.0K.307.CLN-ND; ComponentLink1Description: Manufacturer URL; ComponentLink1URL: http://www.lemo.com; ComponentLink2Description: Datasheet; ComponentLink2URL: http://intra.lemo.ch/catalog/ROW/UK_English/unipole_multipole.pdf
footprint EEG.0K.307.CLN (Socket, Female, Body 14mm dia. Height 17.6 mm, Through hole)
pins: 1, 2, 3, 4, 5, 6, 7
